# Altium footprint library PcbLibLafe.PcbLib: 294 footprints (part 3 of 19)
Each footprint in its own frame and in the unit in brackets; x right, y up, seen from the top. Pads: shape width x height; smd on the part's side, far side on the other; paste and mask are expansions set on the pad; w line width, h text height; cw(c..) or ccw(c..) is an arc to the next point about the centre after c.
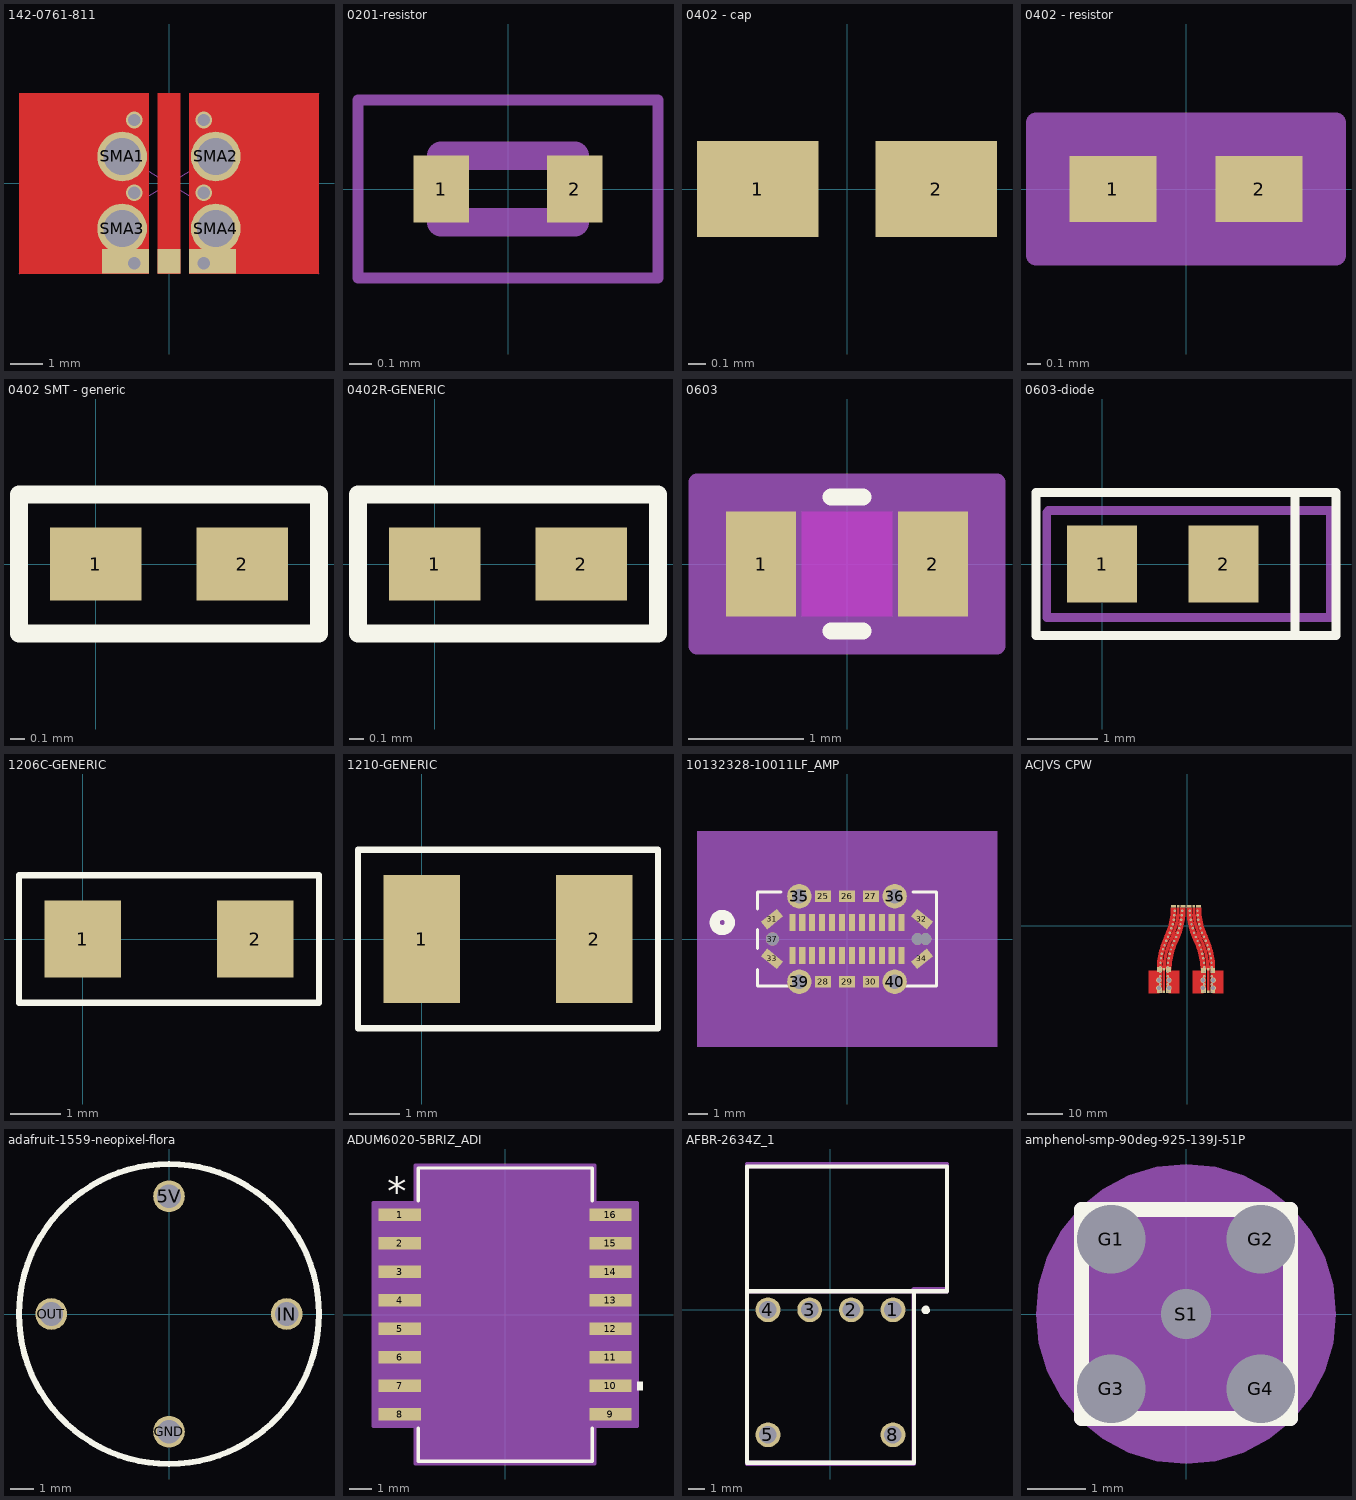
[diagram p2: the footprints below, top view; thin cyan lines are the x and y axes]

## 142-0761-811 [mil] "Emerson pad"
pads (7):
  round 60 hole 45: SMA1(-56.61,32.55) SMA3(-56.61,-54.45) SMA4(56.39,-54.45)
  round 60 hole 45 paste-99999: SMA2(56.39,32.55)
  rect 57x30 smd mask+0: ""(-52.61,-93.95) ""(52.39,-93.95)
  rect 28x30 smd mask+0: ""(-0.11,-93.95)
via 41.89,-11.45 diameter 20 hole 15
via 41.89,-96.45 diameter 20 hole 15
via -42.11,-96.45 diameter 20 hole 15
via -42.11,-11.45 diameter 20 hole 15
via -42.11,76.55 diameter 20 hole 15
via 41.89,76.55 diameter 20 hole 15
Top Layer:
  rectangle: -14,-109 14,109
  rectangle: 24,-109 180.97,109
  rectangle: -181.03,-109 -24,109
Top Solder:
  rectangle: -181.11,-108.95 180.92,109.05
Mechanical 1:
  lines w0.1: -181.08,-108.95 181,108.9 ; -181.08,109.05 180.92,-108.95

## 0201-resistor [mm]
pads (2):
  rect 0.25x0.3 smd: 1(-0.3,0) 2(0.3,0)
Mechanical 13:
  lines w0.127: -0.3,-0.15 -0.3,0.15 0.3,0.15 0.3,-0.15 -0.3,-0.15
Mechanical 15:
  lines w0.05: -0.675,-0.4 -0.675,0.4 0.675,0.4 0.675,-0.4 -0.675,-0.4

## 0402 - cap [mil] "0402 footprint"
pads (2):
  rect 28x22 smd paste+0 mask+0: 1(-20.5,0) 2(20.5,0)
3D body "CAP_GRM155D80J225KE95D_MUR.step": height 22.01, standoff 0, extent -20.51,-10.98 20.51,10.98

## 0402 - resistor [mm]
pads (2):
  rect 0.656x0.5 smd paste+0 mask+0: 1(-0.553,0) 2(0.553,0)
Mechanical 13:
  lines w0.025: -0.525,-0.25 -0.525,0.25 ; -0.525,-0.25 -0.225,-0.25 -0.225,0.25 -0.525,0.25 ; -0.525,-0.25 0.525,-0.25 ; -0.525,-0.25 -0.525,0.25 ; -0.525,0.25 0.525,0.25 ; 0.525,-0.25 0.225,-0.25 0.225,0.25 0.525,0.25 ; 0.525,-0.25 0.525,0.25 ; 0.525,-0.25 0.525,0.25
Mechanical 15:
  region: 1.135,-0.504 -1.135,-0.504 -1.135,0.504 1.135,0.504
  lines w0.152: -1.135,-0.504 -1.135,0.504 1.135,0.504 1.135,-0.504 -1.135,-0.504
3D body "RC0402N_PAN.step": height 0.71, standoff 0, extent -0.525,-0.25 0.525,0.25

## 0402 SMT - generic [mil]
pads (2):
  rect 25x20 smd: 1(0,0) 2(40,0)
Top Overlay:
  lines w5: -21,-19 61,-19 61,19 -21,19 -21,-19
3D body: height 12, standoff 0, extent -4.5,-9.5 41,9.5
3D body: height 13, standoff 12, extent 3.5,-8 43.5,8
3D body: height 14, standoff 0, extent 37,-10 46,10
3D body: height 13, standoff 0, extent -5.5,-10 3.5,10

## 0402R-GENERIC [mil]
pads (2):
  rect 25x20 smd: 1(0,0) 2(40,0)
Top Overlay:
  lines w5: -21,-19 -21,19 61,19 61,-19 -21,-19
3D body: height 13, standoff 0, extent -5.5,-10 3.5,10
3D body: height 14, standoff 0, extent 37,-10 46,10
3D body: height 13, standoff 12, extent 3.5,-8 43.5,8
3D body: height 12, standoff 0, extent -4.5,-9.5 41,9.5

## 0603 [mil]
pads (2):
  rect 24x36 smd paste+0 mask+0: 1(-29.5,0) 2(29.5,0)
Top Overlay:
  lines w6: -5.39,-23 5.39,-23 ; -5.39,23 5.39,23
Keep-Out Layer:
  region: -15.5,-18 -15.5,18 15.5,18 15.5,-18
Mechanical 13:
  lines w1: -33.5,-18 -33.5,18 ; -33.5,-18 33.5,-18 ; -33.5,-18 -17.5,-18 -17.5,18 -33.5,18 ; -33.5,-18 -33.5,18 ; -33.5,18 33.5,18 ; 33.5,-18 33.5,18 ; 33.5,-18 33.5,18 ; 33.5,-18 17.5,-18 17.5,18 33.5,18
Mechanical 15:
  region: 51.5,-28 -51.5,-28 -51.5,28 51.5,28
  lines w6: -51.5,-28 51.5,-28 51.5,28 -51.5,28 -51.5,-28
3D body "YAG_R0603_YAG.step": height 22.01, standoff 0, extent -33.5,-17.99 33.5,17.99

## 0603-diode [mm] "diode 0603"
pads (2):
  rect 1x1.1 smd: 1(0,0) 2(1.727,0)
Top Overlay:
  lines w0.127: 2.743,-0.991 2.743,0.991 ; -0.94,-1.016 3.327,-1.016 3.327,1.016 -0.94,1.016 -0.94,-1.016
Mechanical 40:
  lines w0.076: -0.787,0.737 -0.762,0.762
  lines w0.127: -0.787,0.737 -0.787,-0.762 3.251,-0.762 3.251,0.762 -0.762,0.762 ; 2.743,-0.737 2.743,0.762

## 1206C-GENERIC [mil]
pads (2):
  rect 60x60 smd: 1(0,0) 2(135,0)
Top Overlay:
  lines w5: -50,-50 -50,50 185,50 185,-50 -50,-50
3D body: height 46, standoff 0, extent -8,-29 22,29
3D body: height 45, standoff 0, extent 20,-28 118,28
3D body: height 23, standoff 22, extent 84.5,-16 92,-1
3D body: height 23, standoff 22, extent 74.5,-16 82,-1
3D body: height 23, standoff 22, extent 44.5,-16 52,-1
3D body: height 23, standoff 22, extent 64.5,-16 72,-1
3D body: height 23, standoff 22, extent 69,1.5 76.5,16.5
3D body: height 23, standoff 22, extent 59,1.5 66.5,16.5
3D body: height 23, standoff 22, extent 49,1.5 56.5,16.5
3D body: height 23, standoff 22, extent 39,1.5 46.5,16.5
3D body: height 23, standoff 22, extent 54.5,-16 62,-1
3D body: height 23, standoff 22, extent 79,1.5 86.5,16.5
3D body: height 23, standoff 22, extent 89,1.5 96.5,16.5
3D body: height 46, standoff 0, extent 117,-29 147,29

## 1210-GENERIC [mil]
pads (2):
  rect 60x100 smd: 1(0,0) 2(135,0)
Top Overlay:
  lines w5: -50,-70 185,-70 185,70 -50,70 -50,-70
3D body: height 46, standoff 0, extent -10,-50 20,50
3D body: height 45, standoff 0, extent 18,-49 116,49
3D body: height 23, standoff 22, extent 81.5,-20 89,-5
3D body: height 23, standoff 22, extent 71.5,-20 79,-5
3D body: height 23, standoff 22, extent 41.5,-20 49,-5
3D body: height 23, standoff 22, extent 61.5,-20 69,-5
3D body: height 23, standoff 22, extent 66,-2.5 73.5,12.5
3D body: height 23, standoff 22, extent 56,-2.5 63.5,12.5
3D body: height 23, standoff 22, extent 46,-2.5 53.5,12.5
3D body: height 23, standoff 22, extent 36,-2.5 43.5,12.5
3D body: height 23, standoff 22, extent 51.5,-20 59,-5
3D body: height 23, standoff 22, extent 76,-2.5 83.5,12.5
3D body: height 23, standoff 22, extent 86,-2.5 93.5,12.5
3D body: height 46, standoff 0, extent 115,-50 145,50

## 10132328-10011LF_AMP [mil] "USB-C recepticle"
pads (41):
  rect 32x22 smd: 25(-47.24,84.65) 26(0,84.65) 27(47.24,84.65) 28(-47.24,-84.65) 29(0,-84.65) 30(47.24,-84.65)
  rect 41x20 smd rot 39: 31(-148.43,39.37) 34(148.43,-39.37)
  rect 41x20 smd rot 141: 32(148.43,39.37) 33(-148.43,-39.37)
  round 48 hole 28: 35(-94.49,84.65) 36(94.49,84.65) 39(-94.49,-84.65) 40(94.49,-84.65)
  round 26 hole 26 unplated: 37(-147.64,0)
  rect 12x33 smd paste+0 mask+0: A1(-108.27,32.68) A2(-88.58,32.68) A3(-68.9,32.68) A4(-49.21,32.68) A5(-29.53,32.68) A6(-9.84,32.68) A7(9.84,32.68) A8(29.53,32.68) A9(49.21,32.68) A10(68.9,32.68) A11(88.58,32.68) A12(108.27,32.68) B1(108.27,-32.68) B2(88.58,-32.68) B3(68.9,-32.68) B4(49.21,-32.68) B5(29.53,-32.68) B6(9.84,-32.68) B7(-9.84,-32.68) B8(-29.53,-32.68) B9(-49.21,-32.68) B10(-68.9,-32.68) B11(-88.58,-32.68) B12(-108.27,-32.68)
  round 23 hole 23 unplated: S_1_H1(155.64,0) S_1_H2(139.64,0)
Top Overlay:
  circle w20: c-247,32.68 r15
  lines w6: -177,-60.37 -177,-93.5 -76.34,-93.5 ; -177,-18.37 -177,19.05 ; -177,59.69 -177,93.5 -130.52,93.5 ; 76.34,-93.5 177,-93.5 177,93.5 130.52,93.5
Bottom Overlay:
  circle w20: c-247,32.68 r15
Mechanical 5:
  region: -297,213.5 297,213.5 297,-213.5 -297,-213.5
Mechanical 13:
  circle w20: c-108.27,107.68 r15
  lines w1: -172,-88.5 172,-88.5 172,88.5 -172,88.5 -172,-88.5
Mechanical 15:
  region: 182,118.65 -182,118.65 -182,-105.65 182,-105.65
  lines w6: -182,-105.65 -182,118.65 182,118.65 182,-105.65 -182,-105.65
Multi-Layer:
  lines w23: 139.64,0 155.64,0
3D body: height 10, standoff 0, extent 0,0 10,10
3D body "10132328-10011LF.stp": height 346.54, standoff -51.1, extent -172.05,-88.58 172.05,88.58

## ACJVS CPW [mil] "ACJVS 2 Launch coupled gnd cpw"
pads (26):
  rect 28.5x28.5 smd paste+0 mask+0: CPW1+(-259.64,-733.8) CPW1+(-259.64,-484.9) CPW2+(70.2,215) CPW2+(230.44,-733.8) CPW2+(230.44,-484.9)
  rect 28.5x27.8 smd paste+0 mask+0: CPW1+(-99.4,215)
  rect 55x55 smd paste+0 mask+0: CPW1-(-311.15,-484.9) CPW1-(-310.85,-720.5) CPW1-(-207.65,-720.5) CPW1-(-207.65,-484.9) CPW2-(178.69,-720.5) CPW2-(178.69,-498.4) CPW2-(282.19,-720.5) CPW2-(282.19,-498.4)
  rect 55x28.5 smd paste+0 mask+0: CPW1-(-151.15,215) CPW1-(-47.65,215) CPW2-(18.45,215) CPW2-(121.95,215)
  round 60 hole 45 paste-99999 mask+0: SMA1-1(-316.14,-605.15) SMA1-2(-203.14,-605.15) SMA1-3(-316.14,-692.15) SMA1-4(-203.14,-692.15) SMA2-1(173.94,-605.15) SMA2-2(286.94,-605.15) SMA2-3(173.94,-692.15) SMA2-4(286.94,-692.15)
via -301.64,-734.15 diameter 26 hole 16
via -301.64,-649.15 diameter 26 hole 16
via -301.64,-561.15 diameter 26 hole 16
via -217.64,-734.15 diameter 26 hole 16
via -217.64,-649.15 diameter 26 hole 16
via -217.64,-561.15 diameter 26 hole 16
via -301.5,-510.9 diameter 26 hole 16
via -217.5,-510.9 diameter 26 hole 16
via -301.5,-460.9 diameter 26 hole 16
via -217.5,-460.9 diameter 26 hole 16
via -298.5,-410.9 diameter 26 hole 16
via -214.5,-410.9 diameter 26 hole 16
via -292.5,-360.9 diameter 26 hole 16
via -207.5,-360.9 diameter 26 hole 16
via -282.5,-311.9 diameter 26 hole 16
via -195.5,-311.9 diameter 26 hole 16
via -181.5,-263.9 diameter 26 hole 16
via -269.5,-262.9 diameter 26 hole 16
via -164.5,-215.9 diameter 26 hole 16
via -235.5,-167.9 diameter 26 hole 16
via -143.5,-169.9 diameter 26 hole 16
via -214.5,-122.9 diameter 26 hole 16
via -122.5,-124.9 diameter 26 hole 16
via -193.5,-76.9 diameter 26 hole 16
via -104.5,-77.9 diameter 26 hole 16
via -176.5,-29.9 diameter 26 hole 16
via -89.5,-29.9 diameter 26 hole 16
via -76.5,18.1 diameter 26 hole 16
via -152.5,67.1 diameter 26 hole 16
via -67.5,67.1 diameter 26 hole 16
via -60.5,117.1 diameter 26 hole 16
via 30.5,117.1 diameter 26 hole 16
via 115.5,117.1 diameter 26 hole 16
via 37.5,67.1 diameter 26 hole 16
via 122.5,67.1 diameter 26 hole 16
via 46.5,18.1 diameter 26 hole 16
via 132.5,18.1 diameter 26 hole 16
via 59.5,-29.9 diameter 26 hole 16
via 146.5,-29.9 diameter 26 hole 16
via 74.5,-77.9 diameter 26 hole 16
via 163.5,-76.9 diameter 26 hole 16
via 92.5,-124.9 diameter 26 hole 16
via 184.5,-122.9 diameter 26 hole 16
via 113.5,-169.9 diameter 26 hole 16
via 205.5,-167.9 diameter 26 hole 16
via 134.5,-215.9 diameter 26 hole 16
via 223.5,-214.9 diameter 26 hole 16
via 239.5,-262.9 diameter 26 hole 16
via 151.5,-263.9 diameter 26 hole 16
via 165.5,-311.9 diameter 26 hole 16
via 252.5,-311.9 diameter 26 hole 16
via 177.5,-360.9 diameter 26 hole 16
via 262.5,-360.9 diameter 26 hole 16
via 184.5,-410.9 diameter 26 hole 16
via 268.5,-410.9 diameter 26 hole 16
via 187.5,-460.9 diameter 26 hole 16
via 271.5,-460.9 diameter 26 hole 16
via 187.5,-510.9 diameter 26 hole 16
via 271.5,-510.9 diameter 26 hole 16
via 188.44,-561.15 diameter 26 hole 16
via 188.44,-649.15 diameter 26 hole 16
via 188.44,-734.15 diameter 26 hole 16
via 272.44,-561.15 diameter 26 hole 16
via 272.44,-649.15 diameter 26 hole 16
via 272.44,-734.15 diameter 26 hole 16
via -141.4,167.1 diameter 26 hole 16
via -57.4,167.1 diameter 26 hole 16
via 28.6,167.1 diameter 26 hole 16
via 112.6,167.1 diameter 26 hole 16
via -145.5,117.1 diameter 26 hole 16
via -253.5,-214.9 diameter 26 hole 16
via -162.5,18.1 diameter 26 hole 16
Top Layer:
  rectangle: -175,188.5 -126,203
  rectangle: -111,188 -87,203.5
  rectangle: -72,189.5 -23.5,204
  rectangle: -6,188 43,202.5
  rectangle: 59,188 83.5,202
  rectangle: 97,187.5 146.5,202
  region: 174.1,-135.39 164.63,-116.53 147.91,-77.78 133.48,-38.12 121.37,2.31 111.63,43.38 104.3,84.94 99.4,126.86 96.95,169 96.95,190.1 146.95,190.1 147.24,170.46 149.52,131.25 154.08,92.23 160.9,53.55 169.96,15.33 181.23,-22.29 194.66,-59.2 210.22,-95.27 218.78,-112.95 218.79,-112.95 229.61,-134.5 248.71,-178.79 265.21,-224.11 279.05,-270.31 290.17,-317.24 298.55,-364.73 304.15,-412.64 306.95,-460.79 306.95,-484.9 256.95,-484.9 256.62,-462.25 253.99,-417.03 248.73,-372.03 240.86,-327.42 230.41,-283.34 217.42,-239.95 201.92,-197.38 183.98,-155.78
  region: 139.7,-152.67 129.72,-132.81 112.12,-92 96.91,-50.24 84.17,-7.66 73.91,35.59 66.2,79.36 61.03,123.51 58.45,167.88 58.45,190.1 81.95,190.1 82.26,168.57 84.77,125.58 89.77,82.81 97.25,40.41 107.18,-1.49 119.53,-42.74 134.26,-83.21 151.31,-122.74 160.7,-142.12 160.7,-142.13 170.68,-161.99 188.28,-202.8 203.49,-244.56 216.23,-287.14 226.49,-330.39 234.2,-374.16 239.37,-418.31 241.95,-462.68 241.95,-484.9 218.45,-484.9 218.14,-463.37 215.63,-420.38 210.63,-377.61 203.15,-335.21 193.22,-293.31 180.87,-252.06 166.14,-211.59 149.09,-172.06
  region: 81.61,-181.85 70.79,-160.3 51.69,-116.01 35.19,-70.69 21.35,-24.49 10.23,22.44 1.85,69.93 -3.75,117.84 -6.55,165.99 -6.55,190.1 43.45,190.1 43.78,167.45 46.41,122.23 51.67,77.23 59.54,32.62 69.99,-11.46 82.98,-54.85 98.48,-97.42 116.42,-139.02 126.29,-159.4 126.3,-159.41 135.77,-178.27 152.49,-217.02 166.92,-256.68 179.03,-297.11 188.77,-338.18 196.1,-379.74 201,-421.66 203.45,-463.8 203.45,-484.9 153.45,-484.9 153.16,-465.26 150.88,-426.05 146.32,-387.04 139.5,-348.35 130.44,-310.13 119.17,-272.51 105.74,-235.6 90.18,-199.53
  region: -247.65,-484.9 -247.34,-463.37 -244.83,-420.38 -239.83,-377.61 -232.35,-335.21 -222.42,-293.31 -210.07,-252.06 -195.34,-211.59 -178.28,-172.05 -168.9,-152.67 -158.93,-132.82 -141.32,-92 -126.11,-50.24 -113.37,-7.66 -103.11,35.59 -95.4,79.36 -90.23,123.51 -87.65,167.88 -87.65,190.1 -111.15,190.1 -111.46,168.57 -113.97,125.58 -118.97,82.81 -126.45,40.41 -136.38,-1.49 -148.73,-42.74 -163.46,-83.21 -180.52,-122.75 -189.9,-142.13 -199.87,-161.98 -217.48,-202.8 -232.69,-244.56 -245.43,-287.14 -255.69,-330.39 -263.4,-374.16 -268.57,-418.31 -271.15,-462.68 -271.15,-484.9
  region: -182.65,-484.9 -182.36,-465.26 -180.08,-426.05 -175.52,-387.03 -168.7,-348.35 -159.64,-310.13 -148.37,-272.5 -134.94,-235.59 -119.38,-199.53 -110.82,-181.85 -99.99,-160.3 -80.89,-116.02 -64.39,-70.7 -50.55,-24.49 -39.43,22.44 -31.05,69.93 -25.45,117.84 -22.65,165.99 -22.65,190.1 -72.65,190.1 -72.98,167.45 -75.61,122.23 -80.87,77.23 -88.74,32.62 -99.19,-11.46 -112.18,-54.86 -127.68,-97.42 -145.62,-139.02 -155.5,-159.41 -164.97,-178.26 -181.69,-217.02 -196.12,-256.68 -208.23,-297.11 -217.97,-338.18 -225.3,-379.74 -230.2,-421.66 -232.65,-463.8 -232.65,-484.9
  region: -286.15,-484.9 -285.82,-462.25 -283.19,-417.03 -277.93,-372.03 -270.06,-327.42 -259.61,-283.34 -246.62,-239.94 -231.12,-197.38 -213.18,-155.78 -203.3,-135.39 -193.83,-116.54 -177.11,-77.78 -162.68,-38.12 -150.57,2.31 -140.83,43.38 -133.5,84.94 -128.6,126.86 -126.15,169 -126.15,190.1 -176.15,190.1 -176.44,170.46 -178.72,131.25 -183.28,92.23 -190.1,53.55 -199.16,15.33 -210.43,-22.3 -223.86,-59.21 -239.42,-95.27 -247.98,-112.95 -258.81,-134.5 -277.91,-178.78 -294.41,-224.1 -308.25,-270.31 -319.37,-317.24 -327.75,-364.73 -333.35,-412.64 -336.15,-460.79 -336.15,-484.9
  region: -207.65,-500.9 -90.5,-500.9 -90.5,-748 -207.5,-748
  region: -428.3,-500.9 -311.15,-500.9 -311.5,-748 -428.3,-748
  region: 61.54,-500.9 178.69,-500.9 177.5,-748 61.54,-748
  region: 282.19,-500.9 399.34,-500.9 399.34,-748 282.19,-748
  lines w5: -336.15,-484.9 cw(c492.51,-484.9) -247.99,-112.95 ccw(c-851.31,190.1) -176.24,201 ; -286.15,-484.9 cw(c492.51,-484.9) -203.31,-135.4 ccw(c-851.31,190.1) -126.25,202 ; -271.15,-484.9 cw(c492.51,-484.9) -189.9,-142.13 ; -247.65,-484.9 cw(c492.51,-484.9) -168.9,-152.68 ; -232.65,-484.9 cw(c492.51,-484.9) -155.5,-159.41 ccw(c-851.31,190.1) -72.75,202.52 ; -189.9,-142.12 ccw(c-851.31,190.1) -111.24,201.5 ; -182.65,-484.9 cw(c492.51,-484.9) -110.82,-181.85 ccw(c-851.31,190.1) -22.74,202.53 ; -168.9,-152.67 ccw(c-851.31,190.1) -87.74,202 ; -6.45,202.99 ccw(c822.11,190.1) 81.61,-181.85 cw(c-521.71,-484.9) 153.45,-484.9 ; 43.53,200.98 ccw(c822.11,190.1) 126.29,-159.4 cw(c-521.71,-484.9) 203.45,-484.9 ; 58.53,200.99 ccw(c822.11,190.1) 139.7,-152.67 ; 82.03,200.98 ccw(c822.11,190.1) 160.7,-142.12 ; 97.03,200.98 ccw(c822.11,190.1) 174.1,-135.39 cw(c-521.71,-484.9) 256.95,-484.9 ; 139.7,-152.68 cw(c-521.71,-484.9) 218.45,-484.9 ; 147.05,201.47 ccw(c822.11,190.1) 218.78,-112.95 cw(c-521.71,-484.9) 306.95,-484.9 ; 160.7,-142.13 cw(c-521.71,-484.9) 241.95,-484.9
  lines w28.5: -259.64,-733.8 -259.64,-484.9 ; 230.44,-733.8 230.44,-484.9
  lines w55: -310.85,-720 -310.85,-477 ; -207.65,-720.5 -207.65,-484.9 ; 178.69,-720.5 178.69,-498.4 ; 282.19,-720.5 282.19,-498.4
Mid-Layer 1:
  region: -11.45,225 -11.45,-4.45 -11.57,-232.57 -20.5,-232.9 -28.74,-233.17 -45.08,-235.32 -61,-239.59 -76.23,-245.89 -90.5,-254.13 -103.58,-264.17 -115.23,-275.82 -125.27,-288.9 -133.51,-303.17 -139.81,-318.4 -144.08,-334.32 -146.23,-350.66 -146.5,-358.9 -146.5,-368.9 -146.12,-377.22 -143.73,-393.7 -139.2,-409.73 -132.63,-425.03 -124.11,-439.34 -113.8,-452.42 -101.87,-464.04 -88.53,-474 -74,-482.14 -58.53,-488.31 -42.39,-492.4 -25.85,-494.36 -17.52,-494.52 -16.5,-742.5 -438,-742.5 -438,-499.8 -178.5,225
  region: -11.5,225 -11.58,-232.58 -8.5,-232.9 -0.26,-233.17 16.08,-235.32 32,-239.59 47.23,-245.89 61.5,-254.13 74.58,-264.17 86.23,-275.82 96.26,-288.9 104.51,-303.17 110.81,-318.4 115.08,-334.32 117.23,-350.66 117.5,-358.9 117.5,-368.9 116.92,-377.42 114.11,-394.27 109.12,-410.6 102.04,-426.14 92.99,-440.63 82.13,-453.81 69.64,-465.45 55.74,-475.37 40.66,-483.39 24.66,-489.38 8.02,-493.22 -8.98,-494.86 -17.52,-494.84 -17.52,-742.5 410,-742.5 410,-501.7 149.5,225

## adafruit-1559-neopixel-flora [mm]
pads (4):
  round 1.37 hole 1.02: 5V(0,5.08) GND(0,-5.08) IN(5.08,0) OUT(-5.08,0)
Top Overlay:
  circle w0.254: c0,0 r6.476
3D body "half-inch-round-neopixel-board.STEP": height 2.4, standoff -9.4, extent -6.35,-6.35 6.35,6.35

## ADUM6020-5BRIZ_ADI [mil]
pads (16):
  rect 74.18x22 smd paste+0 mask+0: 1(-184.59,175) 2(-184.59,125) 3(-184.59,75) 4(-184.59,25) 5(-184.59,-25) 6(-184.59,-75) 7(-184.59,-125) 8(-184.59,-175) 9(184.59,-175) 10(184.59,-125) 11(184.59,-75) 12(184.59,-25) 13(184.59,25) 14(184.59,75) 15(184.59,125) 16(184.59,175)
Top Overlay:
  region: 231.68,-117.5 241.68,-117.5 241.68,-132.5 231.68,-132.5
  lines w6: -152.5,-199.1 -152.5,-257 152.5,-257 152.5,-199.1 ; -152.5,199.1 -152.5,257 152.5,257 152.5,199.1
  text "*" at -207.09,192 h50
Mechanical 13:
  lines w0: -12,252 ccw(c0,252) 12,252
  lines w1: -207.68,-185 -147.5,-185 -147.5,-165 -207.68,-165 -207.68,-185 ; -207.68,-135 -147.5,-135 -147.5,-115 -207.68,-115 -207.68,-135 ; -207.68,-85 -147.5,-85 -147.5,-65 -207.68,-65 -207.68,-85 ; -207.68,-35 -147.5,-35 -147.5,-15 -207.68,-15 -207.68,-35 ; -207.68,15 -147.5,15 -147.5,35 -207.68,35 -207.68,15 ; -207.68,65 -147.5,65 -147.5,85 -207.68,85 -207.68,65 ; -207.68,115 -147.5,115 -147.5,135 -207.68,135 -207.68,115 ; -207.68,165 -147.5,165 -147.5,185 -207.68,185 -207.68,165 ; -147.5,-252 -147.5,252 147.5,252 147.5,-252 -147.5,-252 ; 147.5,-185 207.68,-185 207.68,-165 147.5,-165 147.5,-185 ; 147.5,-135 207.68,-135 207.68,-115 147.5,-115 147.5,-135 ; 147.5,-85 207.68,-85 207.68,-65 147.5,-65 147.5,-85 ; 147.5,-35 207.68,-35 207.68,-15 147.5,-15 147.5,-35 ; 147.5,15 207.68,15 207.68,35 147.5,35 147.5,15 ; 147.5,65 207.68,65 207.68,85 147.5,85 147.5,65 ; 147.5,115 207.68,115 207.68,135 147.5,135 147.5,115 ; 147.5,165 207.68,165 207.68,185 147.5,185 147.5,165
  text "*" at -145,199 h50
Mechanical 15:
  region: -157.5,-196 -231.68,-196 -231.68,196 -157.5,196 -157.5,262 157.5,262 157.5,196 231.68,196 231.68,-196 157.5,-196 157.5,-262 -157.5,-262
  lines w6: -231.68,-196 -157.5,-196 -157.5,-262 157.5,-262 157.5,-196 231.68,-196 231.68,196 157.5,196 157.5,262 -157.5,262 -157.5,196 -231.68,196 -231.68,-196
3D body "ADUM6020-5BRIZ_ADI.step": height 104.09, standoff 0, extent -207.68,-252.01 207.68,252.01

## AFBR-2634Z_1 [mm]
pads (6):
  round 1.51 hole 1.067: 1(3.81,0) 2(1.27,0) 3(-1.27,0) 4(-3.81,0) 5(-3.81,-7.62) 8(3.81,-7.62)
Top Overlay:
  lines w0.254: -5.1,-9.32 -5.1,1.13 ; -5.08,-9.32 5.1,-9.32 5.1,1.13 ; 5.918,0.076 ccw(c5.814,-0.006) 5.947,-0.006 ; -5.1,1.13 -5.1,8.73 7.1,8.73 7.1,1.13 5.1,1.13 ; -5.1,1.13 5.1,1.13
Mechanical 13:
  lines w0.254: -5.1,1.13 -5.1,8.73 7.1,8.73 7.1,1.13 5.1,1.13 ; -5.1,1.13 -5.1,-9.32 5.1,-9.32 5.1,1.13 ; -5.1,1.13 5.1,1.13
Mechanical 40:
  lines w0.254: -5.08,-9.398 5.08,-9.398 5.08,1.27 7.112,1.27 7.112,8.89 -5.08,8.89 -5.08,8.636 -5.08,-9.398
3D body "User Library-optokonektor-1.STEP": height 18.78, standoff -3.27, extent -5.638,-9.398 7.162,8.902

## amphenol-smp-90deg-925-139J-51P [mil]
pads (5):
  round 31.5 hole 46.06 mask+2.95: G1(-50,50) G2(50,50) G3(-50,-50) G4(50,-50)
  round 31.5 hole 33.46 mask+2.95: S1(0,0)
Top Overlay:
  lines w10: -70,-70 -70,70 70,70 70,-70 -70,-70
Mechanical 1:
  lines w10: -70,-70 -70,70 70,70 70,-70 -70,-70
  text "J1" at -19.57,165.04 h30
Mechanical 3:
  pour cut-out: 100.48,0 98.55,19.6 92.83,38.45 83.55,55.83 71.05,71.05 55.83,83.55 38.45,92.83 19.6,98.55 0,100.48 -19.6,98.55 -38.45,92.83 -55.83,83.55 -71.05,71.05 -83.55,55.83 -92.83,38.45 -98.55,19.6 -100.48,0 -98.55,-19.6 -92.83,-38.45 -83.55,-55.83 -71.05,-71.05 -55.83,-83.55 -38.45,-92.83 -19.6,-98.55 0,-100.48 19.6,-98.55 38.45,-92.83 55.83,-83.55 71.05,-71.05 83.55,-55.83 92.83,-38.45 98.55,-19.6